# Altium footprint library boxer_pas.PcbLib: 67 footprints (part 3 of 5)
Each footprint in its own frame and in the unit in brackets; x right, y up, seen from the top. Pads: shape width x height; smd on the part's side, far side on the other; paste and mask are expansions set on the pad; w line width, h text height; cw(c..) or ccw(c..) is an arc to the next point about the centre after c.
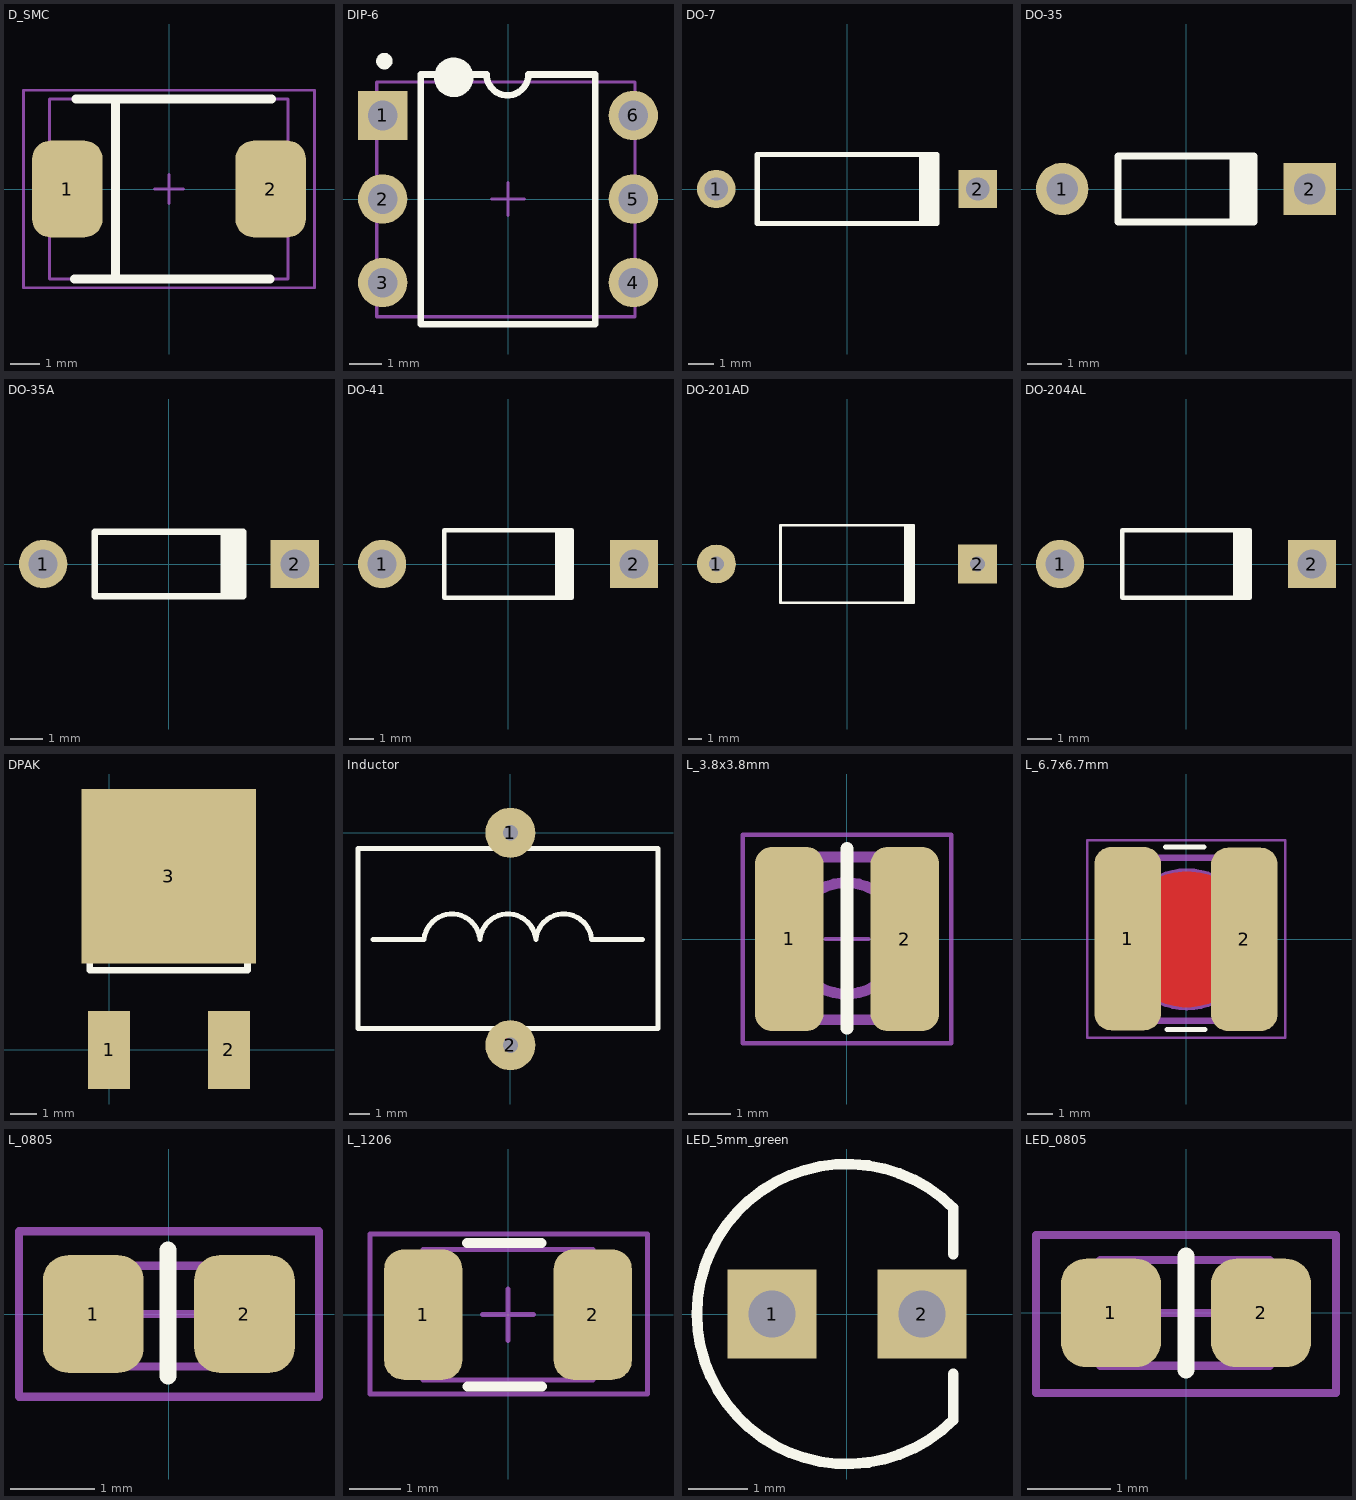
[diagram p2: the footprints below, top view; thin cyan lines are the x and y axes]

## D_SMC [mm] "DO-214-AB/SMC; 2 C-Bend Leads; Body 7.9 x 5.9 mm, inc. leads (LxW)"
height 2.65
pads (2):
  rrect50% 2.4x3.3 smd: 1(-3.475,0) 2(3.475,0)
Top Overlay:
  lines w0.3: -3.226,-3.073 3.454,-3.073 ; -3.175,3.073 3.505,3.073 ; -1.829,-3.073 -1.829,3.073
Mechanical 1:
  lines w0.1: -0.2,0 0.2,0 ; 0,-0.2 0,0.2
Mechanical 13:
  lines w0.1: -4.089,-3.073 4.064,-3.073 4.064,3.073 -4.089,3.073 -4.089,-3.073
  text ".Value" at -0.991,-0.203 h0.5
  text ".Designator" at -1.731,3.509 h0.5
Mechanical 15:
  lines w0.1: -0.5,0 0.5,0 ; 0,-0.5 0,0.5 ; -4.974,-3.373 4.974,-3.373 4.974,3.373 -4.974,3.373 -4.974,-3.373
3D body "User Library-DIOM8261X24.step": height 2.4, standoff 0.03, extent -4.065,-3.05 4.065,3.05

## DIP-6 [mm] "DIP; 6 Leads; Row Spacing 7.62 mm; Pitch 2.54 mm"
height 5.46
pads (6):
  rect 1.5x1.5 hole 0.9: 1(-3.81,2.54)
  round 1.5 hole 0.9: 2(-3.81,0) 3(-3.81,-2.54) 4(3.81,-2.54) 5(3.81,0) 6(3.81,2.54)
Top Overlay:
  circle w0.6: c-1.65,3.7 r0.3
  circle w0.25: c-3.759,4.191 r0.125
  lines w0.2: -2.65,-3.81 -2.65,3.785 -0.652,3.785 ccw(c-0.017,3.785) 0.618,3.785 2.65,3.785 2.65,-3.81 -2.65,-3.81
Mechanical 13:
  lines w0.1: -3.988,-3.581 3.861,-3.581 3.861,3.556 -3.988,3.556 -3.988,-3.581
Mechanical 15:
  lines w0.1: -0.5,0 0.5,0 ; 0,-0.5 0,0.5
3D body "User Library-DIP6-White.STEP": height 4.4, standoff -2.9, extent -3.984,-3.564 3.886,3.556

## DO-7 [mm] "Diode, Axial; Body 7 x 2.7 mm (LxDia. max), Lead Dia. 0.53 mm (max)"
height 2.7
pads (2):
  round 1.5 hole 0.9: 1(-5.1,0)
  rect 1.5x1.5 hole 0.9: 2(5.1,0)
Top Overlay:
  rectangle: 2.8,-1.35 3.6,1.35
  lines w0.2: 3.5,-1.35 -3.5,-1.35 -3.5,1.35 3.5,1.35

## DO-35 [mm] "Diode, Axial; Body 3.8 x 1.9 mm (LxDia. max), Lead Dia. 0.53 mm (max)"
height 1.9
pads (2):
  round 1.5 hole 0.9: 1(-3.55,0)
  rect 1.5x1.5 hole 0.9: 2(3.55,0)
Top Overlay:
  rectangle: 1.25,-0.95 2.05,0.95
  lines w0.2: 1.95,-0.95 -1.95,-0.95 -1.95,0.95 1.95,0.95

## DO-35A [mm] "Diode, Axial; Body 4.6 x 1.9 mm (LxDia. max), Lead Dia. 0.53 mm (max)"
height 2
pads (2):
  round 1.5 hole 0.9: 1(-3.9,0)
  rect 1.5x1.5 hole 0.9: 2(3.9,0)
Top Overlay:
  rectangle: 1.6,-1 2.4,1
  lines w0.2: 2.3,-1 -2.3,-1 -2.3,1 2.3,1

## DO-41 [mm] "Diode, Axial; Body 5.2 x 2.7 mm (LxDia. max), Lead Dia. 0.86 mm (max)"
height 2.8
pads (2):
  round 2 hole 1.2: 1(-5.23,0)
  rect 2x2 hole 1.2: 2(5.23,0)
Top Overlay:
  rectangle: 1.95,-1.4 2.75,1.4
  lines w0.2: 2.65,-1.4 -2.65,-1.4 -2.65,1.4 2.65,1.4

## DO-201AD [mm] "Diode, Axial; Body 9.5 x 5.6 mm (LxDia. max), Lead Dia. 1.32 mm (max)"
height 5.6
pads (2):
  round 2.8 hole 1.1: 1(-9.42,0)
  rect 2.8x2.8 hole 1.1: 2(9.42,0)
Top Overlay:
  rectangle: 4.1,-2.8 4.9,2.8
  lines w0.2: 4.8,-2.8 -4.8,-2.8 -4.8,2.8 4.8,2.8
3D body: height 7.98, standoff 2, extent -5.004,-3.07 4.996,2.918
3D body: height 8, standoff 1.98, extent 3.005,-3.09 4.005,2.943
3D body: height 5.99, standoff 4, extent 4.891,-0.991 9.891,1.005
3D body: height 5.99, standoff 4, extent -9.891,-1.005 -4.891,0.991

## DO-204AL [mm] "Diode, Axial; Body 5.2 x 2.7 mm (LxDia. max), Lead Dia. 0.86 mm (max)"
height 2.7
pads (2):
  round 2 hole 1.2: 1(-5.23,0)
  rect 2x2 hole 1.2: 2(5.23,0)
Top Overlay:
  rectangle: 1.95,-1.4 2.75,1.4
  lines w0.2: 2.65,-1.4 -2.65,-1.4 -2.65,1.4 2.65,1.4

## DPAK [mm]
pads (3):
  rect 1.6x3 smd: 1(0,0) 2(4.6,0)
  rect 6.7x6.7 smd: 3(2.286,6.655)
Top Overlay:
  lines w0.254: -0.737,3.048 -0.737,9.347 5.309,9.347 5.309,3.048 -0.737,3.048

## Inductor [mm]
pads (2):
  round 2.5 hole 0.762: 1(0,0) 2(0,-10.619)
Top Overlay:
  lines w0.254: -6.858,-5.334 -4.318,-5.334 cw(c-2.921,-5.461) -1.524,-5.334 cw(c-0.127,-5.461) 1.27,-5.334 cw(c2.667,-5.461) 4.064,-5.334 6.604,-5.334 ; -7.62,-9.779 -7.62,-0.779 7.38,-0.779 7.38,-9.779 -7.62,-9.779

## L_3.8x3.8mm [mm] "0.150\" L x 0.150\" W (3.80mm x 3.80mm)"
height 1.8
pads (2):
  rrect50% 1.6x4.3 smd: 1(-1.35,0.002) 2(1.35,-0.002)
Top Overlay:
  lines w0.3: 0,-2.083 0,2.108
Mechanical 13:
  circle w0.254: c-0.016,0.015 r1.3
  lines w0.254: -1.916,-1.885 -1.916,1.915 1.884,1.915 1.884,-1.885 -1.916,-1.885
  text ".Value" at -0.864,-0.203 h0.5
  text ".Designator" at -1.655,2.366 h0.5
Mechanical 15:
  lines w0.1: -0.5,0 0.5,0 ; 0,-0.5 0,0.5 ; -2.434,-2.434 2.434,-2.434 2.434,2.434 -2.434,2.434 -2.434,-2.434
3D body "STEP-WE-TPC-3816-rev1.stp": height 1.65, standoff 0, extent -1.916,-1.885 1.884,1.915

## L_6.7x6.7mm [mm] "0.264\" L x 0.264\" W (6.70mm x 6.70mm)"
height 3
pads (2):
  rrect50% 2.65x7.3 smd: 1(-2.324,0.013) 2(2.324,-0.013)
Top Layer:
  pour cut-out: 0.037,2.687 -0.14,2.687 -0.491,2.641 -0.833,2.549 -1.16,2.414 -1.466,2.237 -1.747,2.022 -1.997,1.771 -2.213,1.491 -2.39,1.184 -2.525,0.857 -2.617,0.515 -2.663,0.164 -2.663,-0.013 -2.663,-0.19 -2.617,-0.541 -2.525,-0.882 -2.39,-1.209 -2.213,-1.516 -1.997,-1.797 -1.747,-2.047 -1.466,-2.262 -1.16,-2.439 -0.833,-2.575 -0.491,-2.666 -0.14,-2.713 0.037,-2.713 0.214,-2.713 0.565,-2.666 0.907,-2.575 1.234,-2.439 1.54,-2.262 1.821,-2.047 2.071,-1.797 2.287,-1.516 2.464,-1.209 2.599,-0.882 2.691,-0.541 2.737,-0.19 2.737,-0.013 2.737,0.164 2.691,0.515 2.599,0.857 2.464,1.184 2.287,1.491 2.071,1.771 1.821,2.022 1.54,2.237 1.234,2.414 0.907,2.549 0.565,2.641 0.214,2.687
Top Overlay:
  lines w0.2: -0.813,3.658 0.711,3.658 ; -0.762,-3.607 0.762,-3.607
Mechanical 13:
  circle w0.254: c0.037,-0.012 r2.7
  lines w0.254: -3.213,-3.261 -3.213,3.238 3.287,3.238 3.287,-3.261 -3.213,-3.261
  text ".Value" at -1.016,-0.203 h0.5
  text ".Designator" at -1.858,3.966 h0.5
Mechanical 15:
  lines w0.1: -0.5,0 0.5,0 ; 0,-0.5 0,0.5 ; -3.932,-3.932 -3.932,3.932 3.958,3.932 3.958,-3.932 -3.932,-3.932
3D body "SUMIDA-CDRH6D28.step": height 2.9, standoff 0, extent -3.35,-3.35 3.35,3.35

## L_0805 [mm] "Chip Inductor Body 2.0x1.2mm, IPC Medium Density"
height 0.7
pads (2):
  rrect50% 1.2x1.4 smd: 1(-0.9,0) 2(0.9,0)
Top Overlay:
  lines w0.2: -0.011,-0.737 -0.011,0.762
Mechanical 13:
  lines w0.1: -1.011,-0.625 -1.011,0.575 0.989,0.575 0.989,-0.625 -1.011,-0.625
  text ".Value" at -0.94,-0.254 h0.5
  text ".Designator" at -1.63,0.918 h0.5
Mechanical 15:
  lines w0.1: -0.5,0 0.5,0 ; 0,-0.5 0,0.5 ; -1.784,-0.986 -1.784,0.986 1.788,0.986 1.788,-0.986 -1.784,-0.986
3D body "User Library-ind_0805.step": height 0.95, standoff 0, extent -1.011,-0.625 0.989,0.575

## L_1206 [mil]
pads (2):
  rrect50% 60x100 smd: 1(-65,0) 2(65,0)
Top Overlay:
  lines w7.87: -31.5,55 25.5,55 ; -31,-55 26,-55
Mechanical 13:
  lines w3.94: -65,-50 -65,50 65,50 65,-50 -65,-50
  text ".Value" at -37,-8 h19.68
  text ".Designator" at -74.17,66.14 h19.68
Mechanical 15:
  lines w3.94: -19.68,0 19.69,0 ; 0,-19.68 0,19.69 ; -105.81,-60.81 -105.81,61.81 106.81,61.81 106.81,-60.81 -105.81,-60.81
3D body "User Library-Chip Inductor.step": height 53.15, standoff 0, extent -62.99,-49.22 62.99,49.21

## LED_5mm_green [mm]
pads (2):
  rect 1.5x1.5 hole 0.8 unplated paste-10: 1(-1.27,0) 2(1.27,0)
Top Overlay:
  lines w0.18: 1.796,-1.016 1.796,-1.796 cw(c0,0) 1.796,1.796 ; 1.796,1.016 1.796,1.778
3D body "User Library-LED-D5G.step": height 9.2, standoff -6.25, extent -3,-3 2.5,3

## LED_0805 [mm] "LED; SMD; 0805;"
height 0.7
pads (2):
  rrect50% 1.2x1.3 smd: 1(-0.9,0) 2(0.9,0)
Top Overlay:
  lines w0.2: 0,-0.686 0,0.686
Mechanical 13:
  lines w0.1: -1.027,-0.635 -1.027,0.635 1.005,0.635 1.005,-0.635 -1.027,-0.635
  text ".Designator" at -1.702,0.94 h0.5
  text ".Value" at -0.914,-0.152 h0.5
Mechanical 15:
  lines w0.1: -0.5,0 0.5,0 ; 0,-0.5 0,0.5 ; -1.799,-0.96 -1.799,0.935 1.799,0.935 1.799,-0.96 -1.799,-0.96
3D body "User Library-KP-2012.step": height 1.1, standoff 0, extent -1.001,-0.625 1.001,0.625